# Altium footprint library Mi Libreria.PcbLib: 184 footprints (part 2 of 12)
Each footprint in its own frame and in the unit in brackets; x right, y up, seen from the top. Pads: shape width x height; smd on the part's side, far side on the other; paste and mask are expansions set on the pad; w line width, h text height; cw(c..) or ccw(c..) is an arc to the next point about the centre after c.
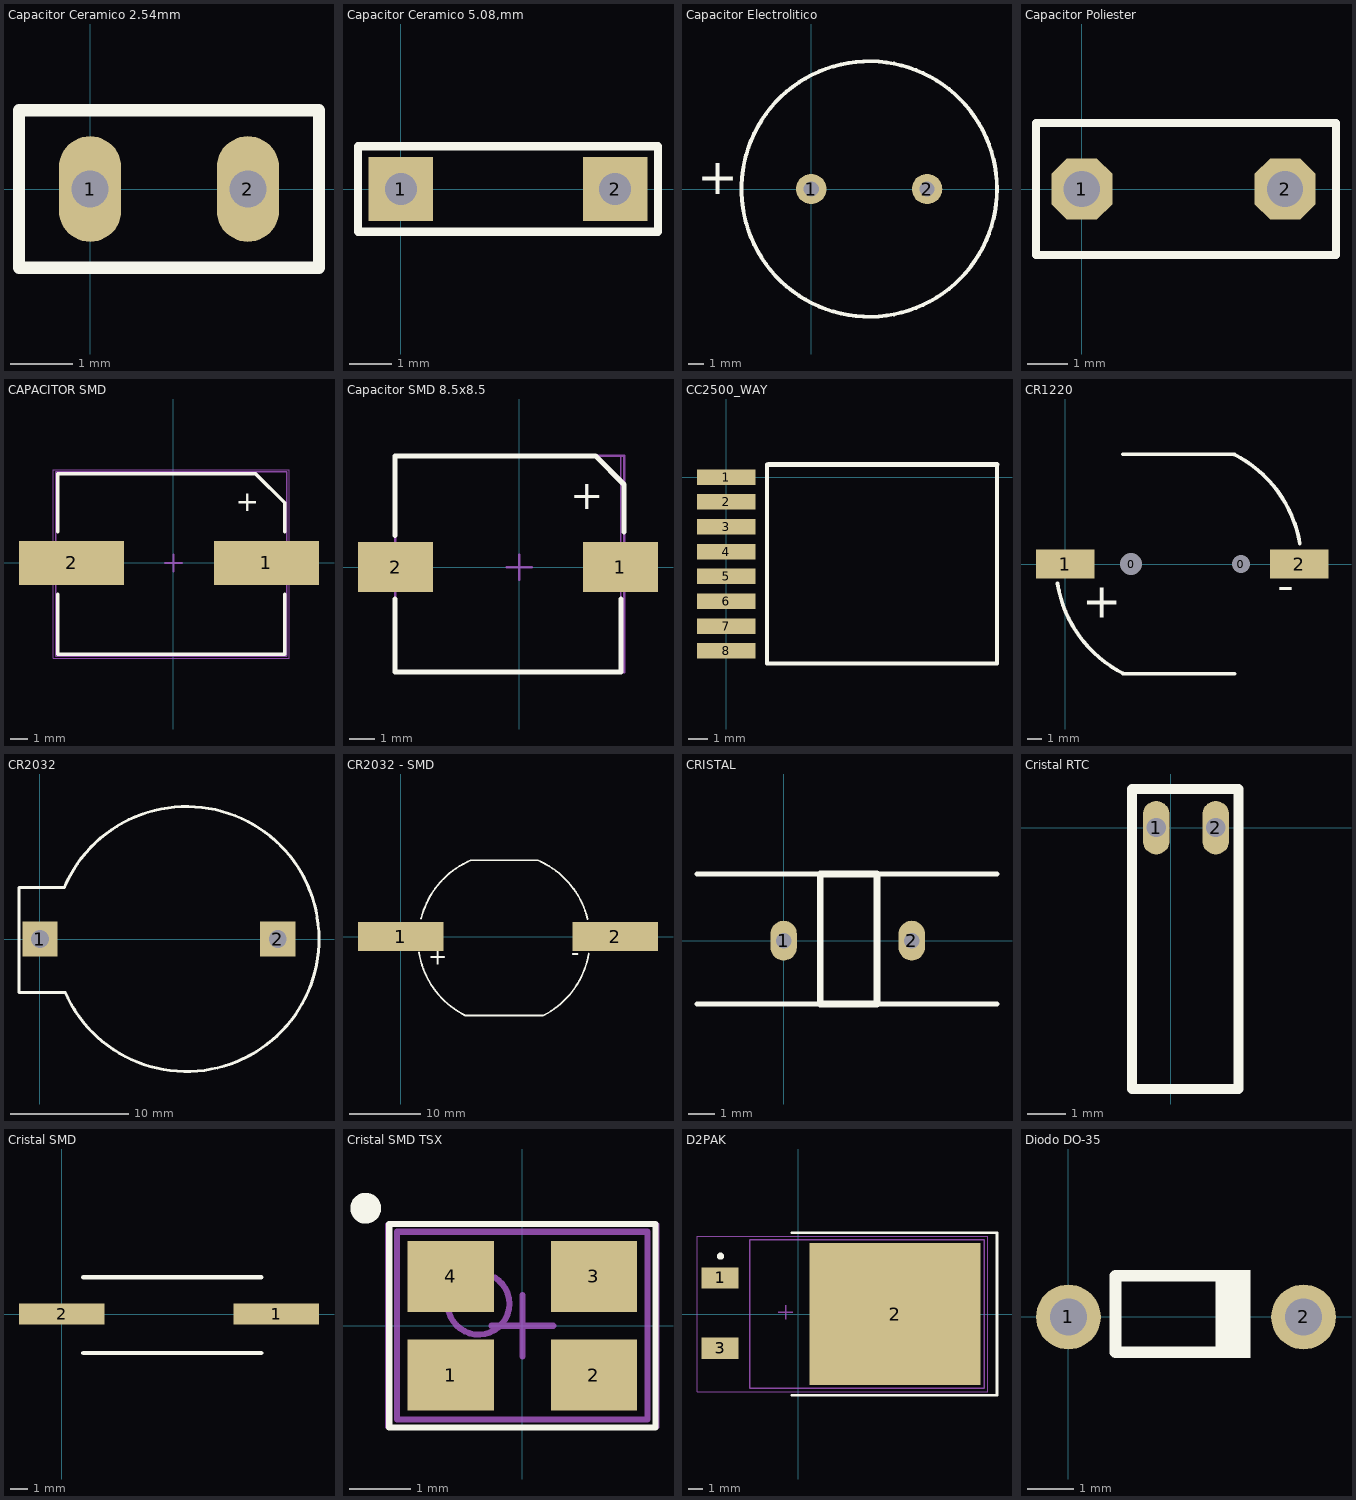
[diagram p1: the footprints below, top view; thin cyan lines are the x and y axes]

## Capacitor Ceramico 2.54mm [mm] "Capacitor Cerámico 4mm Trough Hole"
pads (2):
  oval 1x1.7 hole 0.6: 1(0,0) 2(2.54,0)
Top Overlay:
  lines w0.2: -1.143,-1.27 -1.143,1.27 3.683,1.27 3.683,-1.27 -1.143,-1.27
3D body "C025-020X045.STEP": height 4.73, standoff -2.8, extent -0.927,-1.049 3.468,1.03

## Capacitor Ceramico 5.08,mm [mil] "Capacitor Cerámico TH 5.08mm"
pads (2):
  rect 60x60 hole 30: 1(0,0) 2(200,0)
Top Overlay:
  lines w7.87: -40,-40 -40,40 240,40 240,-40 -40,-40
3D body "User Library-Ceramic Disc Capacitor 0_2in pitch.STEP": height 295.28, standoff -39.37, extent -37.43,-33.39 237.8,33.4

## Capacitor Electrolitico [mm] "Capacitor Electrolitico 16x25"
pads (2):
  round 2 hole 1: 1(0,0) 2(7.603,0)
Top Overlay:
  circle w0.254: c3.81,0 r8.382
  text "+" at -7.493,-1.143 h4
3D body "Cap elect 16x25.STEP": height 26.4, standoff -2.5, extent -4.423,-8.23 12.06,8.231

## Capacitor Poliester [mil] "Capacitor Poliester 5.08mm Pitch"
pads (2):
  oct 60x60 hole 35.43: 1(0,0) 2(200,0)
Top Overlay:
  lines w7.87: -45,-65 250,-65 250,65 -45,65 -45,-65
3D body "POL CAP.step": height 285.43, standoff -206.69, extent -42.4,-59.05 245,59.06

## CAPACITOR SMD [mm] "ELECTROLITICO"
pads (2):
  rect 6x2.5 smd: 1(5.317,0) 2(-5.825,0)
Top Overlay:
  lines w0.2: -6.604,-1.778 -6.604,-5.207 6.35,-5.207 6.35,-1.778 ; -6.604,1.778 -6.604,5.08 4.699,5.08 6.35,3.429 6.35,1.778
  text "+" at 3.556,2.54 h2
Mechanical 13:
  lines w0.1: -6.731,-5.334 6.477,-5.334 6.477,5.207 -6.731,5.207 -6.731,-5.334
Mechanical 15:
  lines w0.05: -6.858,-5.461 6.604,-5.461 6.604,5.334 -6.858,5.334 -6.858,-5.461
  lines w0.1: -0.5,0 0.5,0 ; 0,-0.5 0,0.5
3D body "ELECT CAP SMD.STEP": height 10.2, standoff 0, extent -5.673,-5.15 5.927,5.15

## Capacitor SMD 8.5x8.5 [mm] "Capacitor Electrolitico SMD 8.5x8.5mm"
pads (2):
  rect 3x2 smd: 1(4.047,0) 2(-4.936,0)
Top Overlay:
  lines w0.2: -4.953,-1.27 -4.953,-4.191 4.064,-4.191 4.064,-1.27 ; -4.953,1.27 -4.953,4.445 3.048,4.445 4.191,3.302 4.191,1.397
  text "+" at 2.032,1.905 h2
Mechanical 13:
  lines w0.1: -4.953,-4.191 -4.953,4.445 4.191,4.445 4.191,-4.191 -4.953,-4.191
Mechanical 15:
  lines w0.05: -4.953,-4.191 -4.953,4.445 4.064,4.445 4.064,-4.191 -4.953,-4.191
  lines w0.1: -0.5,0 0.5,0 ; 0,-0.5 0,0.5
3D body "Capacitor Electrolytic SMD.step": height 6.8, standoff 0, extent -4.881,-4.023 4.119,4.277

## CC2500_WAY [mm]
pads (8):
  rect 3x0.8 smd: 1(0,0) 2(0,-1.27) 3(0,-2.54) 4(0,-3.81) 5(0,-5.08) 6(0,-6.35) 7(0,-7.62) 8(0,-8.89)
Top Overlay:
  lines w0.2: 2.085,0.635 2.085,-9.525 13.843,-9.525 13.843,0.635
  lines w0.254: 2.159,0.635 13.843,0.635

## CR1220 [mm] "Battery Holder SMT"
pads (4):
  round 1 hole 1.5: 0(4.485,0)
  round 1 hole 1.22: 0(11.985,0)
  rect 4x2 smd: 1(0,0) 2(15.968,0)
Top Overlay:
  lines w0.254: -0.529,-1.33 ccw(c7.747,0) 3.948,-7.472 ; 3.937,-7.493 11.557,-7.493 ; 3.937,7.493 11.557,7.493 ; 11.546,7.472 cw(c7.747,0) 16.012,1.394
  text "+" at 1.143,-4.445 h4
  text "-" at 14.478,-3.302 h4
3D body "CR1220 SMD.step": height 4.53, standoff -0.22, extent -1.399,-7.366 17.401,7.383

## CR2032 [mm] "Battery Holder TH"
pads (2):
  rect 3x3 hole 1.5: 1(0,0) 2(20.193,0)
Top Overlay:
  lines w0.254: -1.778,-4.543 -1.778,4.356 2.069,4.356 cw(c12.446,0) 2.15,-4.543 -1.778,-4.543
3D body "User Library-CR2032_HOR_HOLD.STEP": height 8.7, standoff -3.8, extent -0.927,-11.127 23.573,10.873

## CR2032 - SMD [mm] "Holder CR2032 SMD"
pads (2):
  rect 12x4 smd: 1(0,0) 2(30,0)
Top Overlay:
  lines w0.254: 2.536,-2.222 ccw(c14.384,-0.316) 9.017,-11.049 19.939,-11.049 ; 2.827,2.492 cw(c14.478,-0.381) 9.782,10.662 ; 9.779,10.668 19.177,10.668 ; 19.168,10.664 cw(c14.478,-0.381) 26.135,2.468 ; 19.998,-11.036 ccw(c14.478,-0.381) 26.308,-2.395
  text "-" at 23.876,-4.191 h4
  text "+" at 3.81,-4.699 h4
3D body "CR2032HSMD.step": height 5.4, standoff 0.1, extent -1.141,-10.127 30.859,9.873

## CRISTAL [mm] "CRISTAL TH"
pads (2):
  oval 1x1.524 hole 0.6: 1(0,0) 2(4.88,0)
Top Overlay:
  lines w0.2: -3.302,-2.413 1.397,-2.413 ; -3.302,2.54 1.397,2.54 ; 3.556,-2.413 8.128,-2.413 ; 3.556,2.54 8.128,2.54
  lines w0.254: 1.397,-2.413 3.556,-2.413 3.556,2.54 1.397,2.54 1.397,-2.413
3D body "CRISTAL.STEP": height 3.6, standoff -3.9, extent -3.262,-2.286 8.088,2.364

## Cristal RTC [mm] "32.768 Khz Th"
pads (2):
  oval 0.7x1.4 hole 0.5: 1(-0.381,0) 2(1.181,0)
Top Overlay:
  lines w0.254: -1.016,-6.858 1.778,-6.858 1.778,1.016 -1.016,1.016 -1.016,-6.858
3D body "CRYSTAL RTC TH.step": height 2.5, standoff -1.5, extent -0.619,-7.016 1.381,0.124

## Cristal SMD [mm] "HC49US SMD Cristal"
pads (2):
  rect 5x1.25 smd: 1(12.571,0) 2(0,0)
Top Overlay:
  lines w0.254: 1.27,-2.286 11.684,-2.286 ; 1.27,2.159 11.684,2.159
3D body "Cristal SMD HC49US.STEP": height 4.3, standoff 0.1, extent 0,-2.413 12.7,2.287

## Cristal SMD TSX [mm] "TSX3225"
height 1
pads (4):
  rect 1.4x1.15 smd: 1(-1.162,-0.8) 2(1.162,-0.8) 3(1.162,0.8) 4(-1.162,0.8)
Top Overlay:
  circle w0.25: c-2.54,1.905 r0.125
  lines w0.1: -2.159,-1.651 -2.159,1.651 2.159,1.651 2.159,-1.651 -2.159,-1.651
Mechanical 13:
  circle w0.1: c-0.71,0.355 r0.5
  lines w0.1: -2.032,-1.524 2.032,-1.524 2.032,1.524 -2.032,1.524 -2.032,-1.524
Mechanical 15:
  lines w0.05: -2.2,-1.651 2.2,-1.651 2.2,1.651 -2.2,1.651 -2.2,-1.651
  lines w0.1: -0.5,0 0.5,0 ; 0,-0.5 0,0.5
3D body "CRISTAL SMD CTS.step": height 0.77, standoff 0, extent -1.6,-1.25 1.6,1.25

## D2PAK [mm] "D2PAK POWER"
pads (3):
  rect 2.6x1.5 smd: 1(-5.493,2.534) 3(-5.493,-2.407)
  rect 12x10 smd: 2(6.811,0)
Top Overlay:
  circle w0.25: c-5.461,4.064 r0.125
  lines w0.2: -0.445,-5.715 13.97,-5.715 13.97,5.715 -0.445,5.715
Mechanical 13:
  lines w0.1: -3.389,-5.207 -3.389,5.207 13.081,5.207 13.081,-5.207 -3.389,-5.207
Mechanical 15:
  lines w0.05: -7.112,-5.461 -7.112,5.461 13.335,5.461 13.335,-5.461 -7.112,-5.461
  lines w0.1: -1.389,0.127 -0.389,0.127 ; -0.889,-0.373 -0.889,0.627
3D body "GDPAK.step": height 4.98, standoff -0.03, extent -5.987,-5.08 9.277,5.08

## Diodo DO-35 [mm] "Diodo Rectificador,Zener cristal DO-35"
pads (2):
  round 1.4 hole 0.8: 1(0,0) 2(5.08,0)
Top Overlay:
  rectangle: 3.175,-0.889 3.937,1.016
  lines w0.254: 3.556,-0.762 1.016,-0.762 1.016,0.889 3.81,0.889
3D body "DO-35.step": height 1.82, standoff -2, extent -0.275,-0.901 5.355,0.901